# Altium footprint library WR-TBL_Pluggable PCB Header.PcbLib: 719 footprints (part 8 of 45)
Each footprint in its own frame and in the unit in brackets; x right, y up, seen from the top. Pads: shape width x height; smd on the part's side, far side on the other; paste and mask are expansions set on the pad; w line width, h text height; cw(c..) or ccw(c..) is an arc to the next point about the centre after c.
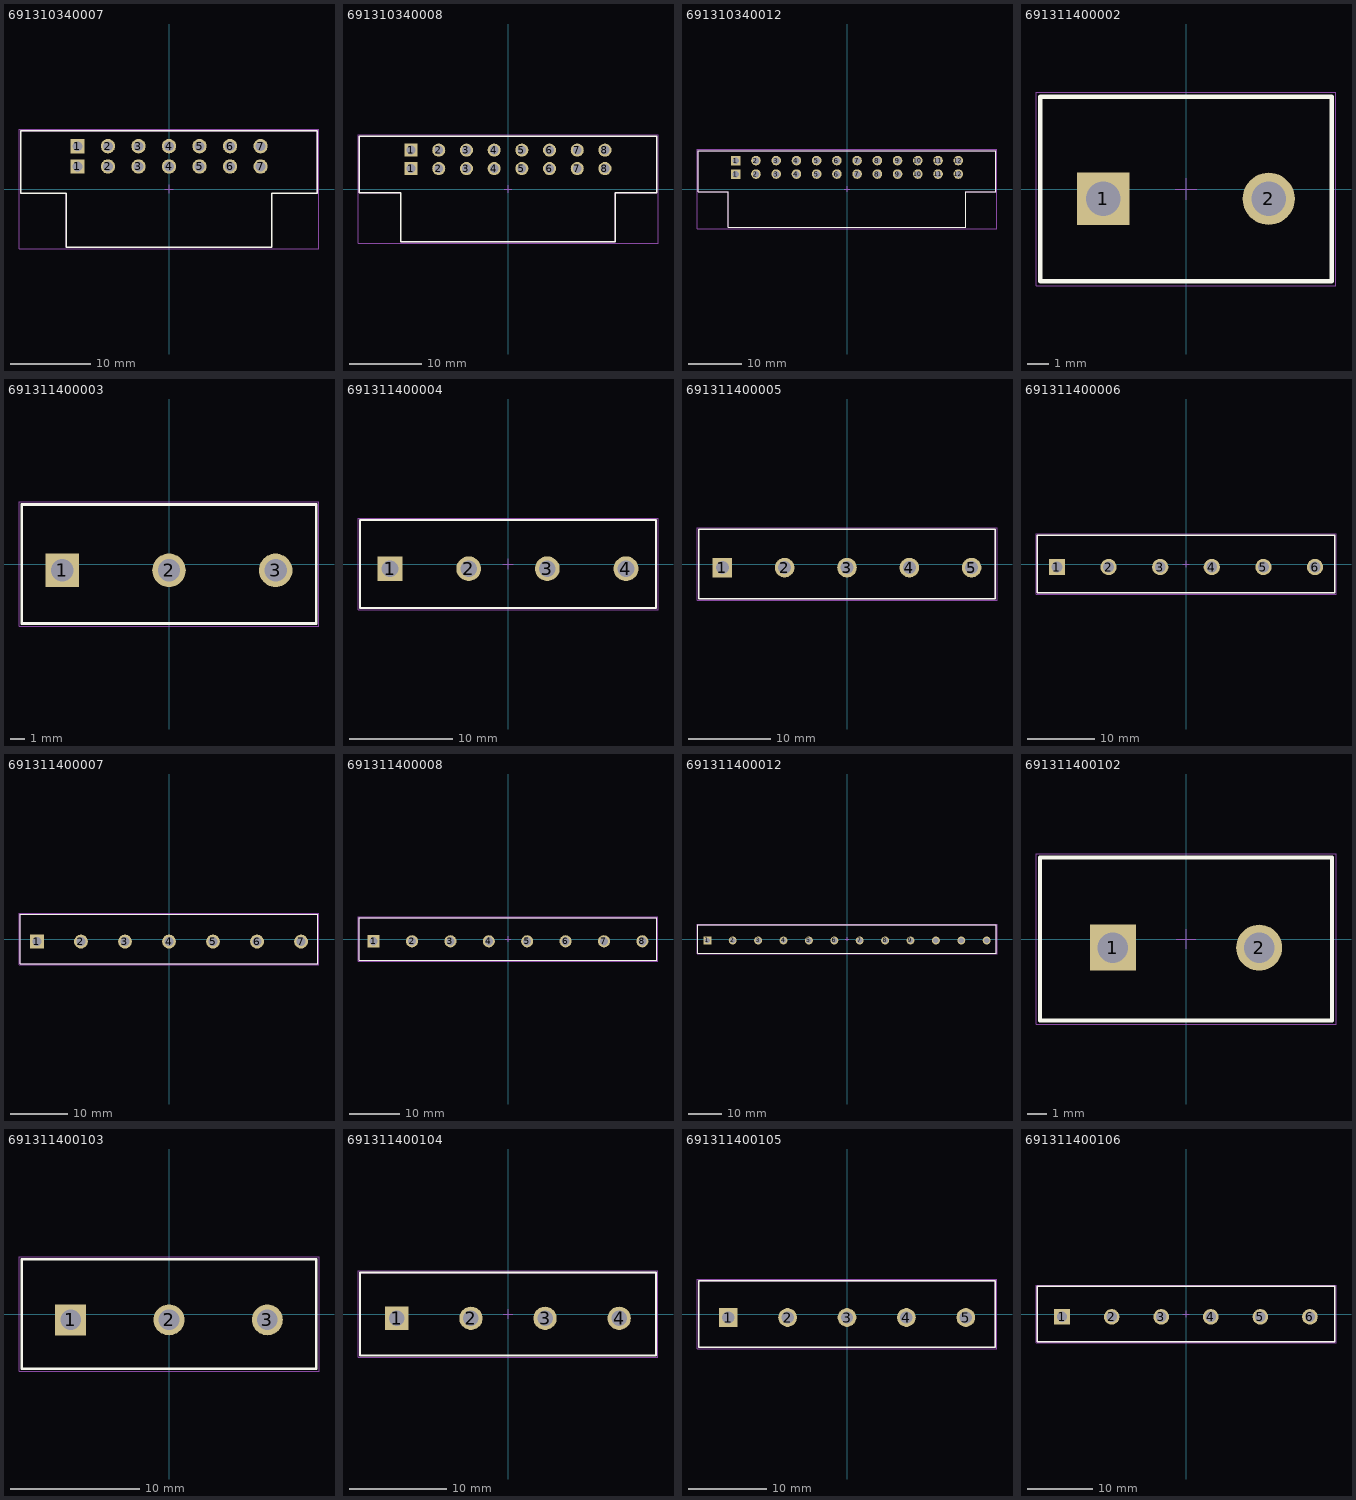
[diagram p7: the footprints below, top view; thin cyan lines are the x and y axes]

## 691310340007 [mm] "Horizontal Reversed PCB Header with Flanges, pitch 3.81mm, 07p"
height 6.8
pads (14):
  rect 1.8x1.8 hole 1.2: 1(-11.43,2.81) 1(-11.43,5.35)
  round 1.8 hole 1.2: 2(-7.62,2.81) 2(-7.62,5.35) 3(-3.81,2.81) 3(-3.81,5.35) 4(0,2.81) 4(0,5.35) 5(3.81,2.81) 5(3.81,5.35) 6(7.62,2.81) 6(7.62,5.35) 7(11.43,2.81) 7(11.43,5.35)
Top Overlay:
  lines w0.2: -18.53,-0.55 -18.53,7.25 18.53,7.25 18.53,-0.55 12.83,-0.55 12.83,-7.25 -12.83,-7.25 -12.83,-0.55 -18.53,-0.55
Mechanical 13:
  lines w0.1: -18.53,-0.55 -12.83,-0.55 -12.83,-7.25 12.83,-7.25 12.83,-0.55 18.53,-0.55 18.53,7.25 -18.53,7.25 -18.53,-0.55
Mechanical 15:
  lines w0.05: -0.5,0 0.5,0 ; 0,-0.5 0,0.5 ; -18.73,-7.45 -18.73,7.45 18.73,7.45 18.73,-7.45 -18.73,-7.45
3D body "691310340007.stp": height 6.85, standoff -3.35, extent -18.53,-7.25 18.53,7.25

## 691310340008 [mm] "Horizontal Reversed PCB Header with Flanges, pitch 3.81mm, 08p"
height 6.8
pads (16):
  rect 1.8x1.8 hole 1.2: 1(-13.335,2.81) 1(-13.335,5.35)
  round 1.8 hole 1.2: 2(-9.525,2.81) 2(-9.525,5.35) 3(-5.715,2.81) 3(-5.715,5.35) 4(-1.905,2.81) 4(-1.905,5.35) 5(1.905,2.81) 5(1.905,5.35) 6(5.715,2.81) 6(5.715,5.35) 7(9.525,2.81) 7(9.525,5.35) 8(13.335,2.81) 8(13.335,5.35)
Top Overlay:
  lines w0.2: -20.435,-0.55 -20.435,7.25 20.435,7.25 20.435,-0.55 14.735,-0.55 14.735,-7.25 -14.735,-7.25 -14.735,-0.55 -20.435,-0.55
Mechanical 13:
  lines w0.1: -20.435,-0.55 -14.735,-0.55 -14.735,-7.25 14.735,-7.25 14.735,-0.55 20.435,-0.55 20.435,7.25 -20.435,7.25 -20.435,-0.55
Mechanical 15:
  lines w0.05: -0.5,0 0.5,0 ; 0,-0.5 0,0.5 ; -20.635,-7.45 -20.635,7.45 20.635,7.45 20.635,-7.45 -20.635,-7.45
3D body "691310340008.stp": height 6.85, standoff -3.35, extent -20.435,-7.25 20.435,7.25

## 691310340012 [mm] "Horizontal Reversed PCB Header with Flanges, pitch 3.81mm, 12p"
height 6.8
pads (24):
  rect 1.8x1.8 hole 1.2: 1(-20.955,2.81) 1(-20.955,5.35)
  round 1.8 hole 1.2: 2(-17.145,2.81) 2(-17.145,5.35) 3(-13.335,2.81) 3(-13.335,5.35) 4(-9.525,2.81) 4(-9.525,5.35) 5(-5.715,2.81) 5(-5.715,5.35) 6(-1.905,2.81) 6(-1.905,5.35) 7(1.905,2.81) 7(1.905,5.35) 8(5.715,2.81) 8(5.715,5.35) 9(9.525,2.81) 9(9.525,5.35) 10(13.335,2.81) 10(13.335,5.35) 11(17.145,2.81) 11(17.145,5.35) 12(20.955,2.81) 12(20.955,5.35)
Top Overlay:
  lines w0.2: -28.055,-0.55 -28.055,7.25 28.055,7.25 28.055,-0.55 22.355,-0.55 22.355,-7.25 -22.355,-7.25 -22.355,-0.55 -28.055,-0.55
Mechanical 13:
  lines w0.1: -28.055,-0.55 -22.355,-0.55 -22.355,-7.25 22.355,-7.25 22.355,-0.55 28.055,-0.55 28.055,7.25 -28.055,7.25 -28.055,-0.55
Mechanical 15:
  lines w0.05: -0.5,0 0.5,0 ; 0,-0.5 0,0.5 ; -28.255,-7.45 -28.255,7.45 28.255,7.45 28.255,-7.45 -28.255,-7.45
3D body "691310340012.stp": height 6.85, standoff -3.35, extent -28.055,-7.25 28.055,7.25

## 691311400002 [mm] "7.62 mm - Open Vertical PCB Header - 2p"
height 12
pads (2):
  rect 2.4x2.4 hole 1.6: 1(-3.81,-0.45)
  round 2.4 hole 1.6: 2(3.81,-0.45)
Top Overlay:
  lines w0.2: -6.71,-4.25 -6.71,4.25 6.71,4.25 6.71,-4.25 -6.71,-4.25
Mechanical 13:
  lines w0.1: -6.71,-4.25 6.71,-4.25 6.71,4.25 -6.71,4.25 -6.71,-4.25
Mechanical 15:
  lines w0.05: -0.5,0 0.5,0 ; 0,-0.5 0,0.5 ; -6.91,-4.45 6.91,-4.45 6.91,4.45 -6.91,4.45 -6.91,-4.45
3D body "691311400002.stp": height 12.05, standoff -3.95, extent -6.71,-4.25 6.71,4.25

## 691311400003 [mm] "7.62 mm - Open Vertical PCB Header - 3p"
height 12
pads (3):
  rect 2.4x2.4 hole 1.6: 1(-7.62,-0.45)
  round 2.4 hole 1.6: 2(0,-0.45) 3(7.62,-0.45)
Top Overlay:
  lines w0.2: -10.52,-4.25 10.52,-4.25 10.52,4.25 -10.52,4.25 -10.52,-4.25
Mechanical 13:
  lines w0.1: -10.52,-4.25 -10.52,4.25 10.52,4.25 10.52,-4.25 -10.52,-4.25
Mechanical 15:
  lines w0.05: -0.5,0 0.5,0 ; 0,-0.5 0,0.5 ; -10.72,-4.45 -10.72,4.45 10.72,4.45 10.72,-4.45 -10.72,-4.45
3D body "691311400003.stp": height 12.05, standoff -3.95, extent -10.52,-4.25 10.52,4.25

## 691311400004 [mm] "7.62 mm - Open Vertical PCB Header - 4p"
height 12
pads (4):
  rect 2.4x2.4 hole 1.6: 1(-11.43,-0.45)
  round 2.4 hole 1.6: 2(-3.81,-0.45) 3(3.81,-0.45) 4(11.43,-0.45)
Top Overlay:
  lines w0.2: -14.33,-4.25 14.33,-4.25 14.33,4.25 -14.33,4.25 -14.33,-4.25
Mechanical 13:
  lines w0.1: -14.33,-4.25 -14.33,4.25 14.33,4.25 14.33,-4.25 -14.33,-4.25
Mechanical 15:
  lines w0.05: -0.5,0 0.5,0 ; 0,-0.5 0,0.5 ; -14.53,-4.45 -14.53,4.45 14.53,4.45 14.53,-4.45 -14.53,-4.45
3D body "691311400004.stp": height 12.05, standoff -3.95, extent -14.33,-4.25 14.33,4.25

## 691311400005 [mm] "7.62 mm - Open Vertical PCB Header - 5p"
height 12
pads (5):
  rect 2.4x2.4 hole 1.6: 1(-15.24,-0.45)
  round 2.4 hole 1.6: 2(-7.62,-0.45) 3(0,-0.45) 4(7.62,-0.45) 5(15.24,-0.45)
Top Overlay:
  lines w0.2: -18.14,-4.25 -18.14,4.25 18.14,4.25 18.14,-4.25 -18.14,-4.25
Mechanical 13:
  lines w0.1: -18.14,-4.25 18.14,-4.25 18.14,4.25 -18.14,4.25 -18.14,-4.25
Mechanical 15:
  lines w0.05: -0.5,0 0.5,0 ; 0,-0.5 0,0.5 ; -18.34,-4.45 18.34,-4.45 18.34,4.45 -18.34,4.45 -18.34,-4.45
3D body "691311400005.stp": height 12.05, standoff -3.95, extent -18.14,-4.25 18.14,4.25

## 691311400006 [mm] "7.62 mm - Open Vertical PCB Header - 6p"
height 12
pads (6):
  rect 2.4x2.4 hole 1.6: 1(-19.05,-0.45)
  round 2.4 hole 1.6: 2(-11.43,-0.45) 3(-3.81,-0.45) 4(3.81,-0.45) 5(11.43,-0.45) 6(19.05,-0.45)
Top Overlay:
  lines w0.2: -21.95,-4.25 -21.95,4.25 21.95,4.25 21.95,-4.25 -21.95,-4.25
Mechanical 13:
  lines w0.1: -21.95,-4.25 21.95,-4.25 21.95,4.25 -21.95,4.25 -21.95,-4.25
Mechanical 15:
  lines w0.05: -0.5,0 0.5,0 ; 0,-0.5 0,0.5 ; -22.15,-4.45 22.15,-4.45 22.15,4.45 -22.15,4.45 -22.15,-4.45
3D body "691311400006.stp": height 12.05, standoff -3.95, extent -21.95,-4.25 21.95,4.25

## 691311400007 [mm] "7.62 mm - Open Vertical PCB Header - 7p"
height 12
pads (7):
  rect 2.4x2.4 hole 1.6: 1(-22.86,-0.45)
  round 2.4 hole 1.6: 2(-15.24,-0.45) 3(-7.62,-0.45) 4(0,-0.45) 5(7.62,-0.45) 6(15.24,-0.45) 7(22.86,-0.45)
Top Overlay:
  lines w0.2: -25.76,-4.25 25.76,-4.25 25.76,4.25 -25.76,4.25 -25.76,-4.25
Mechanical 13:
  lines w0.1: -25.76,-4.25 -25.76,4.25 25.76,4.25 25.76,-4.25 -25.76,-4.25
Mechanical 15:
  lines w0.05: -0.5,0 0.5,0 ; 0,-0.5 0,0.5 ; -25.96,-4.45 -25.96,4.45 25.96,4.45 25.96,-4.45 -25.96,-4.45
3D body "691311400007.stp": height 12.05, standoff -3.95, extent -25.76,-4.25 25.76,4.25

## 691311400008 [mm] "7.62 mm - Open Vertical PCB Header - 8p"
height 12
pads (8):
  rect 2.4x2.4 hole 1.6: 1(-26.67,-0.45)
  round 2.4 hole 1.6: 2(-19.05,-0.45) 3(-11.43,-0.45) 4(-3.81,-0.45) 5(3.81,-0.45) 6(11.43,-0.45) 7(19.05,-0.45) 8(26.67,-0.45)
Top Overlay:
  lines w0.2: -29.57,-4.25 -29.57,4.25 29.57,4.25 29.57,-4.25 -29.57,-4.25
Mechanical 13:
  lines w0.1: -29.57,-4.25 29.57,-4.25 29.57,4.25 -29.57,4.25 -29.57,-4.25
Mechanical 15:
  lines w0.05: -0.5,0 0.5,0 ; 0,-0.5 0,0.5 ; -29.77,-4.45 29.77,-4.45 29.77,4.45 -29.77,4.45 -29.77,-4.45
3D body "691311400008.stp": height 12.05, standoff -3.95, extent -29.57,-4.25 29.57,4.25

## 691311400012 [mm] "7.62 mm - Open Vertical PCB Header - 12p"
height 12
pads (12):
  rect 2.4x2.4 hole 1.6: 1(-41.91,-0.45)
  round 2.4 hole 1.6: 2(-34.29,-0.45) 3(-26.67,-0.45) 4(-19.05,-0.45) 5(-11.43,-0.45) 6(-3.81,-0.45) 7(3.81,-0.45) 8(11.43,-0.45) 9(19.05,-0.45) 10(26.67,-0.45) 11(34.29,-0.45) 12(41.91,-0.45)
Top Overlay:
  lines w0.2: -44.81,-4.25 -44.81,4.25 44.81,4.25 44.81,-4.25 -44.81,-4.25
Mechanical 13:
  lines w0.1: -44.81,-4.25 44.81,-4.25 44.81,4.25 -44.81,4.25 -44.81,-4.25
Mechanical 15:
  lines w0.05: -0.5,0 0.5,0 ; 0,-0.5 0,0.5 ; -45.01,-4.45 45.01,-4.45 45.01,4.45 -45.01,4.45 -45.01,-4.45
3D body "691311400012.stp": height 12.05, standoff -3.95, extent -44.81,-4.25 44.81,4.25

## 691311400102 [mm] "7.62 mm - Closed Vertical PCB Header - 2p"
height 12
pads (2):
  rect 2.4x2.4 hole 1.6: 1(-3.81,-0.45)
  round 2.4 hole 1.6: 2(3.81,-0.45)
Top Overlay:
  lines w0.2: -7.61,-4.25 -7.61,4.25 7.61,4.25 7.61,-4.25 -7.61,-4.25
Mechanical 13:
  lines w0.1: -7.61,-4.25 7.61,-4.25 7.61,4.25 -7.61,4.25 -7.61,-4.25
Mechanical 15:
  lines w0.05: -0.5,0 0.5,0 ; 0,-0.5 0,0.5 ; -7.81,-4.45 -7.81,4.45 7.81,4.45 7.81,-4.45 -7.81,-4.45
3D body "691311400102.stp": height 12.05, standoff -3.95, extent -7.62,-4.26 7.62,4.24

## 691311400103 [mm] "7.62 mm - Closed Vertical PCB Header - 3p"
height 12
pads (3):
  rect 2.4x2.4 hole 1.6: 1(-7.62,-0.45)
  round 2.4 hole 1.6: 2(0,-0.45) 3(7.62,-0.45)
Top Overlay:
  lines w0.2: -11.42,-4.25 -11.42,4.25 11.42,4.25 11.42,-4.25 -11.42,-4.25
Mechanical 13:
  lines w0.1: -11.42,-4.25 11.42,-4.25 11.42,4.25 -11.42,4.25 -11.42,-4.25
Mechanical 15:
  lines w0.05: -0.5,0 0.5,0 ; 0,-0.5 0,0.5 ; -11.62,-4.45 -11.62,4.45 11.62,4.45 11.62,-4.45 -11.62,-4.45
3D body "691311400103.stp": height 12.05, standoff -3.95, extent -11.43,-4.25 11.43,4.25

## 691311400104 [mm] "7.62 mm - Closed Vertical PCB Header - 4p"
height 12
pads (4):
  rect 2.4x2.4 hole 1.6: 1(-11.43,-0.45)
  round 2.4 hole 1.6: 2(-3.81,-0.45) 3(3.81,-0.45) 4(11.43,-0.45)
Top Overlay:
  lines w0.2: -15.23,-4.25 -15.23,4.25 15.23,4.25 15.23,-4.25 -15.23,-4.25
Mechanical 13:
  lines w0.1: -15.23,-4.25 15.23,-4.25 15.23,4.25 -15.23,4.25 -15.23,-4.25
Mechanical 15:
  lines w0.05: -0.5,0 0.5,0 ; 0,-0.5 0,0.5 ; -15.43,-4.45 -15.43,4.45 15.43,4.45 15.43,-4.45 -15.43,-4.45
3D body "691311400104.stp": height 12.05, standoff -3.95, extent -15.24,-4.25 15.24,4.25

## 691311400105 [mm] "7.62 mm - Closed Vertical PCB Header - 5p"
height 12
pads (5):
  rect 2.4x2.4 hole 1.6: 1(-15.24,-0.45)
  round 2.4 hole 1.6: 2(-7.62,-0.45) 3(0,-0.45) 4(7.62,-0.45) 5(15.24,-0.45)
Top Overlay:
  lines w0.2: -19.04,-4.25 19.04,-4.25 19.04,4.25 -19.04,4.25 -19.04,-4.25
Mechanical 13:
  lines w0.1: -19.04,-4.25 -19.04,4.25 19.04,4.25 19.04,-4.25 -19.04,-4.25
Mechanical 15:
  lines w0.05: -0.5,0 0.5,0 ; 0,-0.5 0,0.5 ; -19.24,-4.45 19.24,-4.45 19.24,4.45 -19.24,4.45 -19.24,-4.45
3D body "691311400105.stp": height 12.05, standoff -3.95, extent -19.05,-4.25 19.05,4.25

## 691311400106 [mm] "7.62 mm - Closed Vertical PCB Header - 6p"
height 12
pads (6):
  rect 2.4x2.4 hole 1.6: 1(-19.05,-0.45)
  round 2.4 hole 1.6: 2(-11.43,-0.45) 3(-3.81,-0.45) 4(3.81,-0.45) 5(11.43,-0.45) 6(19.05,-0.45)
Top Overlay:
  lines w0.2: -22.85,-4.25 22.85,-4.25 22.85,4.25 -22.85,4.25 -22.85,-4.25
Mechanical 13:
  lines w0.1: -22.85,-4.25 -22.85,4.25 22.85,4.25 22.85,-4.25 -22.85,-4.25
Mechanical 15:
  lines w0.05: -0.5,0 0.5,0 ; 0,-0.5 0,0.5 ; -23.05,-4.45 23.05,-4.45 23.05,4.45 -23.05,4.45 -23.05,-4.45
3D body "691311400106.stp": height 12.05, standoff -3.95, extent -22.86,-4.25 22.86,4.25